# Altium schematic symbol library SCHLIB.SchLib: 2608 symbols (part 5 of 20) (continued)
## IC-AD7124-8BCPZ-RL7 (continued)
IC ADC 24BIT SIGMA-DELTA 32LFCSP; Manufacturer: Analog Devices; Manufacturer Part Number: AD7124-8BCPZ; Number of Bits: 24; Sampling Rate: 19.2KS/s; Interface: SPI; Number of A/D Converters: 1; Resolution: 24b; Min Supply Voltage: 2.7V; Max Supply Voltage: 3.6V; Dual Supply Voltage: 1.8V; Polarity: Bipolar,Unipolar; Supply Type: Analog,Digital; Input Capacitance: 5.5pF; Common Mode Rejection Ratio: 76dB; Quiescent Current: 2.8mA; Operating Supply Current: 5.6mA; Power Supply Rejection Ratio (PSRR): 95dB; Settling Time: 1us; Slew Rate: 20V/µs; Input Offset Voltage (Vos): 1mV; ComponentLink1URL: http://www.mouser.com/ds/2/609/AD7124-8-586740.pdf?src-supplier=Mouser; ComponentLink1Description: http://www.mouser.com/ds/2/609/AD7124-8-586740.pdf?src-supplier=Mouser; ComponentLink2URL: http://www.analog.com/media/en/technical-documentation/data-sheets/AD7124-8.pdf?src-supplier=Digi-Key; ComponentLink2Description: http://www.analog.com/media/en/technical-documentation/data-sheets/AD7124-8.pdf?src-supplier=Digi-Key; ComponentLink3URL: http://www.analog.com/media/en/technical-documentation/data-sheets/AD7124-8.pdf?src-supplier=Avnet; ComponentLink3Description: http://www.analog.com/media/en/technical-documentation/data-sheets/AD7124-8.pdf?src-supplier=Avnet; ComponentLink4URL: https://www.analog.com/media/en/technical-documentation/data-sheets/ad7124-8.pdf?src-supplier=Digi-Key; ComponentLink4Description: https://www.analog.com/media/en/technical-documentation/data-sheets/ad7124-8.pdf?src-supplier=Digi-Key; Supplier 1: Digi-Key; Supplier Part Number 1: AD7124-8BCPZ-ND; Stock: 2540; Pricing: 1=11.73, 10=10.6, 25=10.1064, 100=8.381, 250=7.6415, 500=7.1485 (USD); RoHS: Yes; Mount: Surface Mount; Number of Pins: 32; Min Operating Temperature: -55°C; Max Operating Temperature: 125°C; Packaging: Tray; Length: 5.1mm; Height: 0.75mm; Width: 5.1mm; REACH SVHC: No SVHC; Lead Free: Contains Lead; ComponentLink5URL: http://www.farnell.com/datasheets/2251043.pdf?src-supplier=Farnell; ComponentLink5Description: http://www.farnell.com/datasheets/2251043.pdf?src-supplier=Farnell; ComponentLink6URL: http://www.farnell.com/datasheets/2081834.pdf?src-supplier=Element14; ComponentLink6Description: http://www.farnell.com/datasheets/2081834.pdf?src-supplier=Element14
footprint 32-WFQFN EP (QFN, 32-Leads, Body 5.1x5.1mm, Pitch 0.5mm, Thermal Pad 3.45X3.45mm, IPC Low Density)
pins: 1 REGCAPD (in), 2 IOVDD (in), 3 DGND (in), 4 AIN0/IOUT/VBIAS (in), 5 AIN1/IOUT/VBIAS (in), 6 AIN2/IOUT/VBIAS/P1 (in), 7 AIN3/IOUT/VBIAS/P2 (in), 8 AIN4/IOUT/VBIAS/P3 (in), 9 AIN5/IOUT/VBIAS/P4 (in), 10 AIN6/IOUT/VBIAS (in), 11 AIN7/IOUT/VBIAS (in), 12 REFIN1(+) (in), 13 REFIN1(−) (in), 14 AIN8/IOUT/VBIAS (in), 15 AIN9/IOUT/VBIAS (in), 16 AIN10/IOUT/VBIAS (in), 17 AIN11/IOUT/VBIAS (in), 18 AIN12/IOUT/VBIAS (in), 19 AIN13/IOUT/VBIAS (in), 20 AIN14/IOUT/VBIAS/REFIN2(+) (in), 21 AIN15/IOUT/VBIAS/REFIN2(-) (in), 22 REFOUT (in), 23 AVSS (in), 24 REGCAPA (in), 25 PSW (in), 26 AVDD (in), 27 SYNC (in), 28 DOUT/ARDY (in), 29 DIN (in), 30 SCLK (in), 31 CLK (in), 32 CS (in), EP (in)

## IC-AD8420ARMZ
designator U?, comment AD8420
IC INST AMP 1 CIRCUIT 8MSOP; Manufacturer: Analog Devices; Manufacturer Part Number: AD8420ARMZ; Min Dual Supply Voltage: 2.7V; Max Dual Supply Voltage: 18V; Input Bias Current: 20nA; Input Offset Voltage (Vos): 125uV; Voltage Gain: 60dB; Number of Circuits: 1; Operating Supply Current: 80uA; Output Current per Channel: 10mA; Bandwidth: 2.5kHz; Slew Rate: 1V/µs; Max Supply Voltage: 36V; Common Mode Rejection Ratio: 100dB; Nominal Supply Current: 75uA; Input Resistance: 1GR; -3db Bandwidth: 250kHz; Number of Amplifiers: 3; Supplier 1: Digi-Key; Supplier Part Number 1: AD8420ARMZ-ND; Stock: 1212; Pricing: 1=2.86, 10=2.571, 25=2.4252, 100=1.94, 250=1.6975, 500=1.649, 1000=1.4065 (USD); RoHS: Yes; Mount: Surface Mount; Case/Package: MSOP; Number of Pins: 8; Contact Plating: Tin,Matte; Min Operating Temperature: -40°C; Max Operating Temperature: 85°C; Number of Elements: 1; Packaging: Rail/Tube; Min Supply Voltage: 2.7V; Number of Channels: 1; Package Quantity: 50; Power Supply Rejection Ratio (PSRR): 100dB; Max Supply Current: 80uA; Length: 3.2mm; Height: 0.95mm; Width: 3.2mm; Lead Free: Contains Lead; REACH SVHC: No SVHC; ComponentLink1URL: https://datasheet.ciiva.com/1135/1525799-1135414.pdf?src-supplier=Element14; ComponentLink1Description: https://datasheet.ciiva.com/1135/1525799-1135414.pdf?src-supplier=Element14; ComponentLink2URL: https://datasheet.ciiva.com/2976/ad8420-2976022.pdf?src-supplier=Avnet; ComponentLink2Description: https://datasheet.ciiva.com/2976/ad8420-2976022.pdf?src-supplier=Avnet; ComponentLink3URL: https://datasheet.ciiva.com/1802/ad8420-1802925.pdf?src-supplier=Digi-Key; ComponentLink3Description: https://datasheet.ciiva.com/1802/ad8420-1802925.pdf?src-supplier=Digi-Key; ComponentLink4URL: https://datasheet.ciiva.com/17373/ad8420-17373343.pdf?src-supplier=Avnet+Europe; ComponentLink4Description: https://datasheet.ciiva.com/17373/ad8420-17373343.pdf?src-supplier=Avnet+Europe
footprint MSOP8 (TSOP, 8-Leads, Body 3,00x3,00mm, Pitch 0,65mm, IPC Medium Density)
pins: 2 +IN A (in), 3 -IN A (in), 4 -VS (power), 5 +VS (power), 6 REF (power), 7 FB (power), 8 OUT (out)

## IC-AD9837BCPZ-RL7
designator U?, comment AD9837  Supplier Part Number 1: AD9837BCPZ-RL7CT-ND
IC WAVEFORM GEN PROG 10LFCSP; Manufacturer: Analog Devices; Manufacturer Part Number: AD9837BCPZ-RL7; Min Supply Voltage: 2.3V; Max Supply Voltage: 5.5V; Resolution: 10b; Operating Supply Voltage: 5V; Number of Converters: 1; Signal to Noise Ratio (SNR): -64dB; Nominal Output Voltage: 645mV; Max Supply Current: 5.5mA; Frequency: 16MHz; Output Type: Voltage; Washability: OK; ComponentLink1URL: https://datasheet.ciiva.com/1138/1700956-1138402.pdf?src-supplier=Element14; ComponentLink1Description: https://datasheet.ciiva.com/1138/1700956-1138402.pdf?src-supplier=Element14; ComponentLink2URL: https://datasheet.ciiva.com/1699/ad9837-1699592.pdf?src-supplier=Digi-Key; ComponentLink2Description: https://datasheet.ciiva.com/1699/ad9837-1699592.pdf?src-supplier=Digi-Key; ComponentLink3URL: https://datasheet.ciiva.com/1699/ad9837-1699593.pdf?src-supplier=Digi-Key; ComponentLink3Description: https://datasheet.ciiva.com/1699/ad9837-1699593.pdf?src-supplier=Digi-Key; ComponentLink4URL: https://datasheet.ciiva.com/1699/ad9837-1699594.pdf?src-supplier=Digi-Key; ComponentLink4Description: https://datasheet.ciiva.com/1699/ad9837-1699594.pdf?src-supplier=Digi-Key; Supplier 1: Digi-Key; Stock 1: 2484; Pricing 1: 1=4.86000, 10=4.36300, 25=4.12520, 100=3.57510, 250=3.39180, 500=3.04344 (USD); RoHS: Yes; Mount: Surface Mount; Number of Pins: 10; Contact Plating: Tin,Matte; Min Operating Temperature: -40°C; Max Operating Temperature: 85°C; Packaging: Tape and Reel; Package Quantity: 1500; Number of D/A Converters: 1; Number of Outputs: 1; Lead Free: Contains Lead; REACH SVHC: No SVHC; ComponentLink5URL: https://datasheet.ciiva.com/14814/73ad9837-14814428.pdf?src-supplier=Arrow; ComponentLink5Description: https://datasheet.ciiva.com/14814/73ad9837-14814428.pdf?src-supplier=Arrow; ComponentLink6URL: https://datasheet.ciiva.com/25889/ad9837-25889607.pdf?src-supplier=Avnet+Europe; ComponentLink6Description: https://datasheet.ciiva.com/25889/ad9837-25889607.pdf?src-supplier=Avnet+Europe; ComponentLink7URL: https://datasheet.ciiva.com/14849/ad9837-14849784.pdf?src-supplier=Digi-Key; ComponentLink7Description: https://datasheet.ciiva.com/14849/ad9837-14849784.pdf?src-supplier=Digi-Key; ComponentLink8URL: https://datasheet.ciiva.com/14849/ad9837-14849785.pdf?src-supplier=Digi-Key; ComponentLink8Description: https://datasheet.ciiva.com/14849/ad9837-14849785.pdf?src-supplier=Digi-Key; ComponentLink9URL: https://datasheet.ciiva.com/14799/ad9837-14799306.pdf?src-supplier=Digi-Key; ComponentLink9Description: https://datasheet.ciiva.com/14799/ad9837-14799306.pdf?src-supplier=Digi-Key; ComponentLink10URL: https://datasheet.ciiva.com/3177/ad9837-3177420.pdf?src-supplier=Avnet; ComponentLink10Description: https://datasheet.ciiva.com/3177/ad9837-3177420.pdf?src-supplier=Avnet
footprint WFDFN-10 (SON, 10-Leads, Body 3,00x3,00mm, Pitch 0,50mm, Thermal Pad 2,36x1,49mm, IPC Medium Density)
pins: 1 COMP, 2 VDD, 3 CAP/2V5, 4 DGND, 5 MCLK, 6 SDATA, 7 SCLK, 8 FSYNC, 9 AGND, 10 VOUT

## IC-ADA4096-2ACPZ-R7
designator U?, comment ADA4096-2
IC OPAMP GP 2 CIRCUIT 8LFCSP; Manufacturer: Analog Devices; Manufacturer Part Number: ADA4096-2ACPZ-R7; Input Capacitance: 7pF; Max Dual Supply Voltage: 15V; Min Dual Supply Voltage: 1.5V; Quiescent Current: 60uA; Slew Rate: 0.25V/µs; -3db Bandwidth: 1.52MHz; Common Mode Rejection Ratio: 77dB; Max Supply Voltage: 30V; Min Supply Voltage: 3V; Voltage Gain: 111dB; Unity Gain Bandwidth Product: 550kHz; Bandwidth: 786kHz; Number of Circuits: 2; Input Bias Current: 3nA; Input Offset Voltage (Vos): 300uV; Operating Supply Current: 120uA; Output Current per Channel: 10mA; Input Voltage Noise Density: 27nV/sqrt Hz; Power Supply Rejection Ratio (PSRR): 100dB; Number of Bits: 24; Sampling Rate: 19.2KS/s; Interface: SPI; Number of A/D Converters: 1; Resolution: 24b; Dual Supply Voltage: 1.8V; Polarity: Bipolar,Unipolar; Supply Type: Analog,Digital; Settling Time: 1us; Supplier 1: Digi-Key; Supplier Part Number 1: ADA4096-2ACPZ-R7CT-ND; Stock: 21540; Pricing: 1=4.96, 10=4.451, 25=4.2076, 100=3.4595, 250=3.1042, 500=2.992, 1000=2.7115 (USD); RoHS: Yes; Mount: Surface Mount; Case/Package: SOP; Number of Pins: 8; Contact Plating: Gold; Min Operating Temperature: -40°C; Max Operating Temperature: 125°C; Packaging: Tape and Reel; Package Quantity: 3000; Gain Bandwidth Product: 786kHz; Number of Channels: 2; Number of Elements: 2; Number of Amplifiers: 2; Lead Free: Contains Lead; REACH SVHC: No SVHC; ComponentLink1URL: https://datasheet.ciiva.com/6628/ada4096-2-4096-4-6628648.pdf?src-supplier=Digi-Key; ComponentLink1Description: https://datasheet.ciiva.com/6628/ada4096-2-4096-4-6628648.pdf?src-supplier=Digi-Key; ComponentLink2URL: https://datasheet.ciiva.com/6628/ada4096-2-4096-4-6628649.pdf?src-supplier=Digi-Key; ComponentLink2Description: https://datasheet.ciiva.com/6628/ada4096-2-4096-4-6628649.pdf?src-supplier=Digi-Key; ComponentLink3URL: https://datasheet.ciiva.com/11712/ada4096-2-4096-4-11712087.pdf?src-supplier=Avnet; ComponentLink3Description: https://datasheet.ciiva.com/11712/ada4096-2-4096-4-11712087.pdf?src-supplier=Avnet; ComponentLink4URL: https://datasheet.ciiva.com/6628/ada4096-2-4096-4-6628650.pdf?src-supplier=Digi-Key; ComponentLink4Description: https://datasheet.ciiva.com/6628/ada4096-2-4096-4-6628650.pdf?src-supplier=Digi-Key; ComponentLink5URL: https://datasheet.ciiva.com/17569/ada4096-2-4096-4-17569245.pdf?src-supplier=Avnet+Europe; ComponentLink5Description: https://datasheet.ciiva.com/17569/ada4096-2-4096-4-17569245.pdf?src-supplier=Avnet+Europe; Supplier 2: Digi-Key; Supplier Part Number 2: AD7124-8BCPZ-ND; Length: 5.1mm; Height: 0.75mm; Width: 5.1mm; ComponentLink6URL: http://www.farnell.com/datasheets/2251043.pdf?src-supplier=Farnell; ComponentLink6Description: http://www.farnell.com/datasheets/2251043.pdf?src-supplier=Farnell; ComponentLink7URL: http://www.mouser.com/ds/2/609/AD7124-8-586740.pdf?src-supplier=Mouser; ComponentLink7Description: http://www.mouser.com/ds/2/609/AD7124-8-586740.pdf?src-supplier=Mouser; ComponentLink8URL: http://www.analog.com/media/en/technical-documentation/data-sheets/AD7124-8.pdf?src-supplier=Avnet; ComponentLink8Description: http://www.analog.com/media/en/technical-documentation/data-sheets/AD7124-8.pdf?src-supplier=Avnet; ComponentLink9URL: https://www.analog.com/media/en/technical-documentation/data-sheets/AD7124-8.pdf?src-supplier=Digi-Key; ComponentLink9Description: https://www.analog.com/media/en/technical-documentation/data-sheets/AD7124-8.pdf?src-supplier=Digi-Key; ComponentLink10URL: http://www.farnell.com/datasheets/2081834.pdf?src-supplier=Element14; ComponentLink10Description: http://www.farnell.com/datasheets/2081834.pdf?src-supplier=Element14
footprint 8-UFDFN EP (SON, 8-Leads, Body 2x2mm, Pitch 0.5mm, Thermal Pad 1.6x1mm)
part A pins: 1 OUT A (out), 2 -IN A (in), 3 +IN A (in), 4 -V (power), 8 +V (power)
part B pins: 4 -V (power), 5 +IN B (in), 6 -IN B (in), 7 OUT B (out), 8 +V (power)
1 alternate drawing of the same symbol

## IC-ADC104S021CIMMX
designator U?, comment ADC104S021
ADC 10BIT 4CH 200KSPS 10-MSOP; Manufacturer: TI National Semiconductor; Manufacturer Part Number: ADC104S021CIMMX/NOPB; Interface: SPI,Serial; Max Power Dissipation: 8mW; Number of Channels: 4; Max Supply Voltage: 5.25V; Min Supply Voltage: 2.7V; Number of Bits: 10; Sampling Rate: 200KS/s; Number of Converters: 1; Resolution: 10b; Polarity: Unipolar; Integral Nonlinearity (INL): -0.4LSB; Supply Type: Single; Signal to Noise Ratio (SNR): 61.8dB; Power Consumption: 1.94mW; Differential Nonlinearity: 0.4LSB; Full Scale Error: 0.7LSB; Operating Supply Voltage: 5V; Supplier 1: Digi-Key; Supplier Part Number 1: 296-44813-1-ND; Stock: 2642; Pricing: 1=2.65, 10=2.38, 25=2.25, 100=1.85, 250=1.66, 500=1.6, 1000=1.33 (USD); RoHS: Yes; Mount: Surface Mount; Case/Package: VSSOP; Number of Pins: 10; Contact Plating: Tin,Matte; Min Operating Temperature: -40°C; Max Operating Temperature: 85°C; Packaging: Tape and Reel; Package Quantity: 3500; Number of Inputs: 4; Number of A/D Converters: 1; Number of Analog Inputs: 4; Number of Elements: 1; Conversion Rate: 200KS/s; Radiation Hardening: No; Lead Free: Lead Free; ComponentLink1URL: https://datasheet.ciiva.com/26888/getdatasheetpartid-660655-26888437.pdf?src-supplier=Verical; ComponentLink1Description: https://datasheet.ciiva.com/26888/getdatasheetpartid-660655-26888437.pdf?src-supplier=Verical; ComponentLink2URL: https://datasheet.ciiva.com/6659/adc104s021-6659898.pdf?src-supplier=Digi-Key; ComponentLink2Description: https://datasheet.ciiva.com/6659/adc104s021-6659898.pdf?src-supplier=Digi-Key
footprint VSSOP-10 (TSSOP, 10-Leads, Body 3x3mm, Pitch 0.5mm, IPC Low Density)
pins: 1 ~{CS} (in), 2 VA (power), 3 GND (power), 4 IN4 (in), 5 IN3 (in), 6 IN2 (in), 7 IN1 (in), 8 DIN (in), 9 DOUT (out), 10 SCLK (in)

## IC-ADC124S021CIMM/NOPB
designator U?, comment ADC124S021
IC ADC 12BIT SAR 10VSSOP; Manufacturer: TI National Semiconductor; Manufacturer Part Number: ADC124S021CIMM/NOPB; Interface: SPI,Serial; Number of A/D Converters: 1; Max Power Dissipation: 11mW; Max Supply Voltage: 5.25V; Min Supply Voltage: 2.7V; Number of Bits: 12; Sampling Rate: 200KS/s; Number of Inputs: 4; Resolution: 12b; Polarity: Unipolar; Signal to Noise Ratio (SNR): 72dB; Operating Supply Voltage: 5V; Nominal Supply Current: 1.5mA; Integral Nonlinearity (INL): -1.1LSB; Power Consumption: 2.2mW; Supplier 1: Digi-Key; Supplier Part Number 1: ADC124S021CIMM/NOPBCT-ND; Stock: 11575; Pricing: 1=3.45, 10=3.094, 25=2.9252, 100=2.405, 250=2.158, 500=2.08 (USD); RoHS: Yes; Mount: Surface Mount; Case/Package: MSOP; Number of Pins: 10; Min Operating Temperature: -40°C; Max Operating Temperature: 85°C; Package Quantity: 1000; Power Dissipation: 11mW; Number of Analog Inputs: 4; Packaging: Tape and Reel; Number of Channels: 4; Number of Converters: 1; Number of Elements: 1; Termination: SMD/SMT; Conversion Rate: 200KS/s; Length: 3mm; Height: 0.86mm; Width: 3mm; Radiation Hardening: No; REACH SVHC: No SVHC; Lead Free: Lead Free; ComponentLink1URL: https://datasheet.ciiva.com/3037/adc124s021-3037889.pdf?src-supplier=Avnet; ComponentLink1Description: https://datasheet.ciiva.com/3037/adc124s021-3037889.pdf?src-supplier=Avnet; ComponentLink2URL: https://datasheet.ciiva.com/41460/001186665-da-01-en-ic-adc-1-adc124s021cimm-nopb-msop-10-tid-41460960.pdf?src-supplier=Conrad; ComponentLink2Description: https://datasheet.ciiva.com/41460/001186665-da-01-en-ic-adc-1-adc124s021cimm-nopb-msop-10-tid-41460960.pdf?src-supplier=Conrad; ComponentLink3URL: https://datasheet.ciiva.com/7988/1919066-7988869.pdf?src-supplier=Element14; ComponentLink3Description: https://datasheet.ciiva.com/7988/1919066-7988869.pdf?src-supplier=Element14; ComponentLink4URL: https://datasheet.ciiva.com/25992/adc124s021-25992264.pdf?src-supplier=Avnet+Europe; ComponentLink4Description: https://datasheet.ciiva.com/25992/adc124s021-25992264.pdf?src-supplier=Avnet+Europe; ComponentLink5URL: https://datasheet.ciiva.com/6666/adc124s021-6666364.pdf?src-supplier=Digi-Key; ComponentLink5Description: https://datasheet.ciiva.com/6666/adc124s021-6666364.pdf?src-supplier=Digi-Key; ComponentLink6URL: https://datasheet.ciiva.com/6666/adc124s021-6666366.pdf?src-supplier=Digi-Key; ComponentLink6Description: https://datasheet.ciiva.com/6666/adc124s021-6666366.pdf?src-supplier=Digi-Key; ComponentLink7URL: https://datasheet.ciiva.com/6666/adc124s021-6666367.pdf?src-supplier=Digi-Key; ComponentLink7Description: https://datasheet.ciiva.com/6666/adc124s021-6666367.pdf?src-supplier=Digi-Key
footprint VSSOP-10 (TSSOP, 10-Leads, Body 3x3mm, Pitch 0.5mm, IPC Low Density)
pins: 1 ~{CS} (in), 2 VA (power), 3 GND (power), 4 IN4 (in), 5 IN3 (in), 6 IN2 (in), 7 IN1 (in), 8 DIN (in), 9 DOUT (out), 10 SCLK (in)

## IC-ADP7142ACPZN-R7
designator IC?, comment ADP7142ACPZN-R7
LDO Regulator Pos 1.5V to 5V 0.2A 6-Pin LFCSP EP T/R; Manufacturer: Analog Devices; Number of Outputs: 1; Max Input Voltage: 40V; Input Bias Current: 1uA; Min Input Voltage: 2.7V; Operating Supply Current: 180uA; Power Supply Rejection Ratio (PSRR): 50dB; Output Type: Adjustable; Polarity: Positive; Quiescent Current: 140uA; Accuracy: 0.8%; Max Output Current: 200mA; Output Voltage: 39.8V; Dropout Voltage: 200mV; Min Current Limit: 250mA; Supplier 1: Mouser; Manufacturer Part Number: ADP7142ACPZN-R7; Stock 1: 18194; Pricing 1: 1=2,91000, 10=2,61000, 25=2,47000, 100=2,03000, 250=1,82000, 500=1,76000 (USD); RoHS: Yes; Mount: Surface Mount; Number of Pins: 6; Contact Plating: Gold; Min Operating Temperature: -40°C; Max Operating Temperature: 125°C; Package Quantity: 3000; Packaging: Tape and Reel; Output Current: 200mA; Number of Regulators: 1; Lead Free: Contains Lead; ComponentLink1URL: http://www.mouser.com/ds/2/609/ADP7142-878904.pdf?src-supplier=Mouser; ComponentLink1Description: http://www.mouser.com/ds/2/609/ADP7142-878904.pdf?src-supplier=Mouser; ComponentLink2URL: https://www.analog.com/media/en/technical-documentation/data-sheets/ADP7142.pdf?src-supplier=Digi-Key; ComponentLink2Description: https://www.analog.com/media/en/technical-documentation/data-sheets/ADP7142.pdf?src-supplier=Digi-Key; ComponentLink3URL: http://www.analog.com/static/imported-files/data_sheets/ADP7142.pdf?src-supplier=Avnet; ComponentLink3Description: http://www.analog.com/static/imported-files/data_sheets/ADP7142.pdf?src-supplier=Avnet; Supplier Part Number 1: 584-ADP7142ACPZN-R7
footprint LFCSP CP-6-3 (6-Lead Lead Frame Chip Scale Package [LFCSP]  2.00 mm × 2.00 mm Body and 0.55 mm Package Height)
pins: 1 VOUT, 2 SNS/ADJ, 3 GND, 4 EN, 5 SS, 6 VIN, 7 EP

## IC-ADS1120IRVAT
designator IC?, comment ADS1120IRVAT
IC ADC CONV 16BIT LP LN 16VQFN; Manufacturer: Texas Instruments; Number of Bits: 16; Sampling Rate: 2000S/s; Number of A/D Converters: 1; Resolution: 16b; Polarity: Bipolar,Unipolar; Supply Type: Analog,Digital; Max Supply Voltage: 5.5V; Dual Supply Voltage: 2.5V; Max Dual Supply Voltage: 2.75V; Power Dissipation: 2.1mW; Min Supply Voltage: 2.3V; Number of Inputs: 4; Interface: SPI; Supplier 1: Arrow; Manufacturer Part Number: ADS1120IRVAT; Stock 1: 95; Pricing 1: 1=4,43700, 10=4,32800, 25=4,25300, 250=4,94100, 2500=4,83200, 25000=4,19000, 125000=3,84500, 250000=3,84200 (USD); RoHS: Yes; Mount: Surface Mount; Case/Package: VQFN; Number of Pins: 16; Contact Plating: Gold; Min Operating Temperature: -40°C; Max Operating Temperature: 125°C; Min Dual Supply Voltage: 2.3V; Package Quantity: 250; Packaging: Cut Tape; Lead Free: Lead Free; ComponentLink1URL: https://datasheet.ciiva.com/29661/ads1120-29661123.pdf?src-supplier=Digi-Key; ComponentLink1Description: https://datasheet.ciiva.com/29661/ads1120-29661123.pdf?src-supplier=Digi-Key; ComponentLink2URL: https://datasheet.ciiva.com/48514/ads1120-48514092.pdf?src-supplier=Avnet; ComponentLink2Description: https://datasheet.ciiva.com/48514/ads1120-48514092.pdf?src-supplier=Avnet; Supplier Part Number 1: ADS1120IRVAT
footprint S-PVQFN-N16 (QFN, 16-Leads, Body 3,50x3,50mm, Pitch 0,50mm, Thermal Pad 2,14x2,14mm, IPC Medium Density)
pins: 1 CLK, 2 DGND (power), 3 AVSS (power), 4 AIN3/REFN1, 5 AIN2, 6 REFNO, 7 REFPO, 8 AIN1, 9 AIN0/REFP1, 10 AVDD (power), 11 DVDD (power), 12 ~{DRDY}, 13 DOUT/~{DRDY}, 14 DIN, 15 SCLK, 16 ~{CS}, 17 EP (power)

## IC-AND-SN74LVC1G08DCKR
designator U?, comment SN74LVC1G08DCKR
IC GATE AND 1CH 2-INP SC70-5; Manufacturer: Texas Instruments; Min Supply Voltage: 1.65V; Max Supply Voltage: 5.5V; Propagation Delay: 4ns; Number of Inputs: 2; Number of Outputs: 1; Low Level Output Current: 32mA; Quiescent Current: 10uA; High Level Output Current: -32mA; Schmitt Trigger Input: No; Washability: OK; Manufacturer Part Number: SN74LVC1G08DCKR; RoHS: Yes; Mount: Surface Mount; Case/Package: SC; Number of Pins: 5; Weight: 8.8E-05oz; Contact Plating: Gold; Min Operating Temperature: -40°C; Max Operating Temperature: 125°C; Logic Function: AND; Packaging: Tape and Reel; Package Quantity: 1; Number of Gates: 1; Number of Input Lines: 2; Number of Output Lines: 1; Number of Circuits: 1; Number of Elements: 1; Turn-On Delay Time: 4ns; Number of Bits: 1; Output Current: 32mA; Max Output Current: 32mA; Termination: SMD/SMT; Length: 2.15mm; Height: 1mm; Width: 1.4mm; Radiation Hardening: No; REACH SVHC: No SVHC; Lead Free: Lead Free; Supplier 1: Digi-Key; Supplier Part Number 1: 296-11602-1-ND; Stock 1: 120042; Pricing 1: 1=0.27000, 10=0.22100, 25=0.18560, 100=0.11740, 250=0.09064, 500=0.07726, 1000=0.05253 (USD); ComponentLink1URL: https://datasheet.ciiva.com/14290/sn74lvc1g08-14290720.pdf?src-supplier=Avnet; ComponentLink1Description: https://datasheet.ciiva.com/14290/sn74lvc1g08-14290720.pdf?src-supplier=Avnet; ComponentLink2URL: https://datasheet.ciiva.com/1864/sn74lvc1g08-1864341.pdf?src-supplier=Digi-Key; ComponentLink2Description: https://datasheet.ciiva.com/1864/sn74lvc1g08-1864341.pdf?src-supplier=Digi-Key; ComponentLink3URL: https://datasheet.ciiva.com/1864/sn74lvc1g08-1864342.pdf?src-supplier=Digi-Key; ComponentLink3Description: https://datasheet.ciiva.com/1864/sn74lvc1g08-1864342.pdf?src-supplier=Digi-Key; ComponentLink4URL: https://datasheet.ciiva.com/1864/sn74lvc1g08-1864343.pdf?src-supplier=Digi-Key; ComponentLink4Description: https://datasheet.ciiva.com/1864/sn74lvc1g08-1864343.pdf?src-supplier=Digi-Key; ComponentLink5URL: https://datasheet.ciiva.com/26048/sn74lvc1g08-26048426.pdf?src-supplier=Avnet+Europe; ComponentLink5Description: https://datasheet.ciiva.com/26048/sn74lvc1g08-26048426.pdf?src-supplier=Avnet+Europe; ComponentLink6URL: https://datasheet.ciiva.com/16503/sn74lvc1g08-16503404.pdf?src-supplier=Avnet+Asia; ComponentLink6Description: https://datasheet.ciiva.com/16503/sn74lvc1g08-16503404.pdf?src-supplier=Avnet+Asia; ComponentLink7URL: https://datasheet.ciiva.com/14290/sn74lvc1g08-14290717.pdf?src-supplier=Avnet; ComponentLink7Description: https://datasheet.ciiva.com/14290/sn74lvc1g08-14290717.pdf?src-supplier=Avnet; ComponentLink8URL: https://datasheet.ciiva.com/28540/1772545-28540798.pdf?src-supplier=Element14; ComponentLink8Description: https://datasheet.ciiva.com/28540/1772545-28540798.pdf?src-supplier=Element14
footprint TSSOP5 (SOT23, 5-Leads, Body 2.15x1.4mm, Pitch 0.65mm, IPC High Density)
pins: 1 A (in) "Input A", 2 B (in) "Input B", 3 GND (power) "Ground Pin", 4 Y (out) "Input A", 5 VCC (power) "Power Pin"

## IC-AOZ1282CI
designator U?, comment AOZ1282CI  Package: SOT23-6
IC REG BUCK ADJ 1.2A SOT23-6; Manufacturer: Alpha & Omega Semiconductor; Number of Outputs: 1; Min Input Voltage: 4.5V; Max Input Voltage: 36V; Min Output Voltage: 800mV; Switching Frequency: 450kHz; Synchronous Rectifier: No; Output Type: Adjustable; Output Configuration: Positive; Washability: OK; Supplier 1: Digi-Key; Stock 1: 332367; Pricing 1: 1=0.89, 10=0.779, 25=0.6896, 100=0.6007, 250=0.52284, 500=0.44496, 1000=0.35597 (USD); Mount: Surface Mount; Number of Pins: 6; Min Operating Temperature: -40°C; Max Operating Temperature: 85°C; Packaging: Tape and Reel; Max Output Voltage: 36V; Output Current: 1.2A; Package Quantity: 1; Output Voltage: 36V; Lead Free: Lead Free; ComponentLink1URL: http://aosmd.com/res/data_sheets/AOZ1282CI.pdf; ComponentLink1Description: http://aosmd.com/res/data_sheets/AOZ1282CI.pdf; ComponentLink2URL: http://components.arrow.com/part/dataview/0323_06084387; ComponentLink2Description: http://components.arrow.com/part/dataview/0323_06084387; Supplier Part Number 1: 785-1613-6-ND; Manufacturer Part Number: AOZ1282CI; RoHS: Yes; Case/Package: SOT-23-6; ComponentLink3URL: https://datasheet.ciiva.com/15081/aoz1282ci-15081829.pdf?src-supplier=Digi-Key; ComponentLink3Description: https://datasheet.ciiva.com/15081/aoz1282ci-15081829.pdf?src-supplier=Digi-Key; ComponentLink4URL: https://datasheet.ciiva.com/15268/1934aoz1282ci-15268300.pdf?src-supplier=Arrow+Europe; ComponentLink4Description: https://datasheet.ciiva.com/15268/1934aoz1282ci-15268300.pdf?src-supplier=Arrow+Europe; ComponentLink5URL: https://datasheet.ciiva.com/18553/aoz1282ci-18553035.pdf?src-supplier=Digi-Key; ComponentLink5Description: https://datasheet.ciiva.com/18553/aoz1282ci-18553035.pdf?src-supplier=Digi-Key; ComponentLink6URL: https://datasheet.ciiva.com/18553/aoz1282ci-18553036.pdf?src-supplier=Digi-Key; ComponentLink6Description: https://datasheet.ciiva.com/18553/aoz1282ci-18553036.pdf?src-supplier=Digi-Key; ComponentLink7URL: https://datasheet.ciiva.com/18553/aoz1282ci-18553037.pdf?src-supplier=Digi-Key; ComponentLink7Description: https://datasheet.ciiva.com/18553/aoz1282ci-18553037.pdf?src-supplier=Digi-Key
footprint SOT23-6L
pins: 1 BS (in), 2 GND (power), 3 FB (in), 4 EN (in), 5 IN (power), 6 LX (out)

## IC-AP2210N-5.0TRG1
designator IC?, comment REG LINEAR 5V 300MA
IC REG LINEAR 5V 300MA SOT23-3; Manufacturer: Diodes; Manufacturer Part Number: AP2210N-5.0TRG1; Polarity: Positive; Quiescent Current: 180uA; Accuracy: 1%; Number of Outputs: 1; Max Input Voltage: 13.2V; Min Input Voltage: 2.5V; Dropout Voltage: 500mV; Max Supply Current: 15mA; Power Supply Rejection Ratio (PSRR): 75dB; Output Type: Fixed; Supplier 1: Mouser; Stock 1: 42905; Pricing 1: 1=0,41000, 10=0,28600, 100=0,13200, 1000=0,10100, 3000=0,08600, 9000=0,07900 (USD); RoHS: Yes; Mount: Surface Mount; Case/Package: TO-236-3; Number of Pins: 3; Contact Plating: Tin; Min Operating Temperature: -40°C; Max Operating Temperature: 125°C; Max Output Current: 300mA; Packaging: Tape and Reel; Output Voltage: 5V; Output Current: 300mA; Number of Regulators: 1; Output Configuration: Positive; Min Output Voltage: 5V; ComponentLink1URL: https://datasheet.ciiva.com/70043/ap2210-70043557.pdf?src-supplier=Digi-Key; ComponentLink1Description: https://datasheet.ciiva.com/70043/ap2210-70043557.pdf?src-supplier=Digi-Key; Supplier Part Number 1: 621-AP2210N-5.0TRG1
footprint SOT23-3
pins: 1 GND, 2 OUT, 3 IN

## IC-AP6714M10G-13
designator U?, comment AP6714
IC REG BST ADJ 1.6A SYNC 10MSOP; Manufacturer: Diodes; Manufacturer Part Number: AP6714M10G-13; Efficiency: 94%; Min Input Voltage: 900mV; Max Input Voltage: 5.5V; Number of Outputs: 1; Switching Frequency: 1.8MHz; Operating Supply Current: 150uA; Min Output Voltage: 1.8V; Output Type: Adjustable; Synchronous Rectifier: Yes; Output Configuration: Positive; Topology: Boost; Washability: OK; Supplier 1: Digi-Key; Supplier Part Number 1: AP6714M10GDICT-ND; Stock 1: 566; Pricing 1: 1=0.88000, 10=0.77200, 25=0.72560, 100=0.54990, 250=0.46800, 500=0.44460, 1000=0.33930 (USD); RoHS: Yes; Mount: Surface Mount; Case/Package: MSOP; Number of Pins: 10; Weight: 0.005051oz; Contact Plating: Tin,Matte; Min Operating Temperature: -40°C; Max Operating Temperature: 85°C; Output Voltage: 5.5V; Max Output Current: 1.6A; Min Supply Voltage: 900mV; Max Output Voltage: 5.5V; Output Current: 1.6A; Packaging: Tape and Reel; Package Quantity: 1; Length: 2.95mm; Height: 0.95mm; Width: 2.95mm; Radiation Hardening: No; Lead Free: Lead Free; REACH SVHC: No SVHC; ComponentLink1URL: https://datasheet.ciiva.com/17293/ap6714-17293987.pdf?src-supplier=Avnet+Europe; ComponentLink1Description: https://datasheet.ciiva.com/17293/ap6714-17293987.pdf?src-supplier=Avnet+Europe; ComponentLink2URL: https://datasheet.ciiva.com/4879/ap6714-7414-4879290.pdf?src-supplier=Mouser; ComponentLink2Description: https://datasheet.ciiva.com/4879/ap6714-7414-4879290.pdf?src-supplier=Mouser; ComponentLink3URL: https://datasheet.ciiva.com/3222/ap6714-3222077.pdf?src-supplier=Avnet; ComponentLink3Description: https://datasheet.ciiva.com/3222/ap6714-3222077.pdf?src-supplier=Avnet; ComponentLink4URL: https://datasheet.ciiva.com/2023/ap6714-2023934.pdf?src-supplier=Digi-Key; ComponentLink4Description: https://datasheet.ciiva.com/2023/ap6714-2023934.pdf?src-supplier=Digi-Key; ComponentLink5URL: https://datasheet.ciiva.com/2023/ap6714-2023933.pdf?src-supplier=Digi-Key; ComponentLink5Description: https://datasheet.ciiva.com/2023/ap6714-2023933.pdf?src-supplier=Digi-Key; ComponentLink6URL: https://datasheet.ciiva.com/2023/ap6714-2023935.pdf?src-supplier=Digi-Key; ComponentLink6Description: https://datasheet.ciiva.com/2023/ap6714-2023935.pdf?src-supplier=Digi-Key
footprint MSOP10 (TSSOP, 10-Leads, Body 3,00x3,00mm, Pitch 0,50mm, IPC Medium Density)
pins: 1 VCC, 2 EN, 3 CC, 4 FB, 5 REF, 6 SGND, 7 PGND, 8 OCP, 9 LX, 10 OUT

## IC-AP7362A-33SP-13
designator U?, comment AP7362A
IC REG LINEAR 3.3V 1.5A 8SO; Manufacturer: Diodes; Manufacturer Part Number: AP7362A-33SP-13; Number of Regulators: 1; Polarity: Positive; Quiescent Current: 25nA; Min Input Voltage: 2.2V; Max Input Voltage: 5.5V; Accuracy: 1.5%; Output Type: Fixed; Supplier 1: Digi-Key; Supplier Part Number 1: AP7362A-33SP-13DICT-ND; Stock: 3699; Pricing: 1=0.6, 10=0.511, 25=0.4772, 100=0.3545, 250=0.3, 500=0.2863, 1000=0.2113 (USD); RoHS: Yes; Mount: Surface Mount; Case/Package: SOP; Number of Pins: 8; Contact Plating: Tin; Min Operating Temperature: -40°C; Max Operating Temperature: 85°C; Packaging: Tape and Reel; Output Voltage: 3.3V; Output Current: 1.5A; Number of Outputs: 1; Max Output Current: 1.5A; ComponentLink1URL: http://www.mouser.com/ds/2/115/AP7362-476331.pdf?src-supplier=Mouser; ComponentLink1Description: http://www.mouser.com/ds/2/115/AP7362-476331.pdf?src-supplier=Mouser; ComponentLink2URL: http://diodes.com/datasheets/AP7362.pdf?src-supplier=Avnet; ComponentLink2Description: http://diodes.com/datasheets/AP7362.pdf?src-supplier=Avnet; ComponentLink3URL: https://www.diodes.com/assets/Datasheets/AP7362.pdf?src-supplier=Digi-Key; ComponentLink3Description: https://www.diodes.com/assets/Datasheets/AP7362.pdf?src-supplier=Digi-Key
footprint SOIC8-EP (SOIC, 8-Leads, Body 5x4mm, Pitch 1.27mm, IPC Low Density)
pins: 1 GND, 2 EN, 3 IN, 4 IN, 5 OUT, 6 OUT, 7 OUT, 8 NC, EP

## IC-AP7363-HA-7
designator U?, comment AP7363
IC REG LIN POS ADJ 1.5A 8DFN; Manufacturer: Diodes; Manufacturer Part Number: AP7363-HA-7; Dropout Voltage: 190mV; Number of Outputs: 1; Min Input Voltage: 2.2V; Max Input Voltage: 5.5V; Output Voltage: 5V; Output Type: Adjustable; Min Output Voltage: 600mV; Polarity: Positive; Accuracy: 1.5%; Supplier 1: Digi-Key; Supplier Part Number 1: AP7363-HA-7DICT-ND; Stock: 9906; Pricing: 1=0.53, 10=0.455, 25=0.4244, 100=0.3151, 250=0.2666, 500=0.2545, 1000=0.1879 (USD); RoHS: Yes; Mount: Surface Mount; Case/Package: TO-252-3; Number of Pins: 8; Weight: 0.139332oz; Min Operating Temperature: -40°C; Max Operating Temperature: 85°C; Output Current: 1.5A; Package Quantity: 3000; Packaging: Tape and Reel; Max Output Current: 1.5A; Number of Regulators: 1; Max Output Voltage: 5V; Radiation Hardening: No; REACH SVHC: No SVHC; ComponentLink1URL: https://datasheet.ciiva.com/8078/1636611-8078229.pdf?src-supplier=Element14; ComponentLink1Description: https://datasheet.ciiva.com/8078/1636611-8078229.pdf?src-supplier=Element14; ComponentLink2URL: https://datasheet.ciiva.com/30016/ap7363-30016557.pdf?src-supplier=Avnet; ComponentLink2Description: https://datasheet.ciiva.com/30016/ap7363-30016557.pdf?src-supplier=Avnet; ComponentLink3URL: https://datasheet.ciiva.com/29568/ap7363-29568764.pdf?src-supplier=Digi-Key; ComponentLink3Description: https://datasheet.ciiva.com/29568/ap7363-29568764.pdf?src-supplier=Digi-Key
footprint 8-UFDFN EP (SON, 8-Leads, Body 2x2mm, Pitch 0.5mm, Thermal Pad 1.6x1mm)
pins: 1 GND_1 (in), 2 VIN_1, 3 VIN_2, 4 VIN_3, 5 VOUT_1, 6 VOUT_2, 7 VOUT_3, 8 ADJ, 9 GND_2 (in)
text: LDO

## IC-AP9101C
designator U?, comment AP9101C
IC BATT PROT LI-ION 1-CELL SOT26; Manufacturer: Diodes; Manufacturer Part Number: AP9101CK6-AYTRG1; Washability: OK; RoHS: No; Case/Package: SOT-23-6; Packaging: Tape and Reel; ComponentLink1URL: https://www.diodes.com/assets/Datasheets/AP9101C.pdf?src-supplier=Digi-Key; ComponentLink1Description: https://www.diodes.com/assets/Datasheets/AP9101C.pdf?src-supplier=Digi-Key; Supplier 1: Digi-Key; Supplier Part Number 1: AP9101CK6-AYTRG1DICT-ND; Stock: 3270; Pricing: 1=0.44, 10=0.356, 25=0.3256, 100=0.2197, 250=0.1818, 500=0.1667, 1000=0.125 (USD)
footprint SOT23-6
pins: 1 DO, 2 VM, 3 CO, 4 NC, 5 VDD, 6 VSS

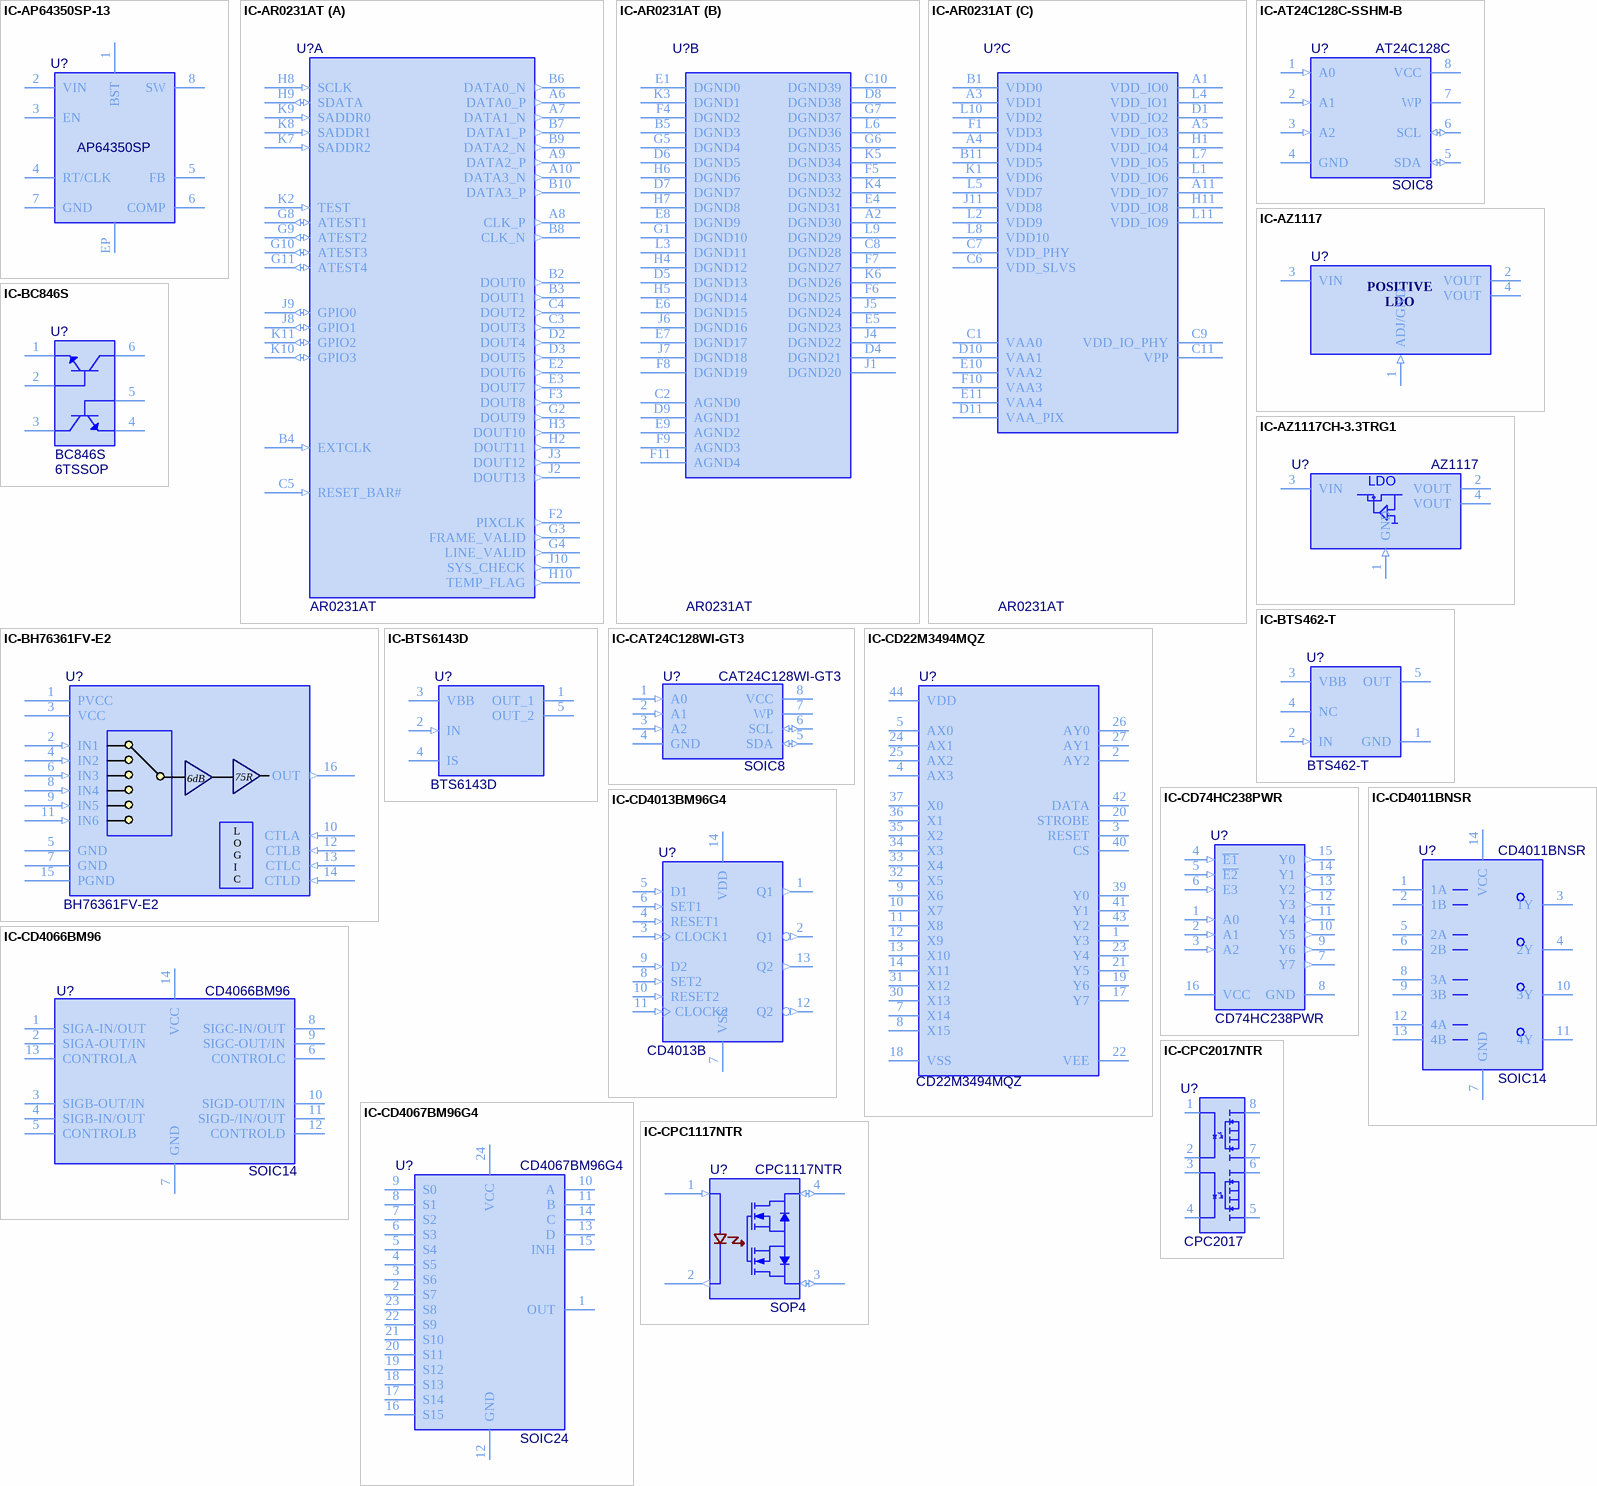
[diagram p17: symbols IC-AP64350SP-13 to IC-CPC2017NTR]

## IC-AP64350SP-13
designator U?, comment AP64350SP
DCDC CONV HV BUCK SO-8EP; Manufacturer 1: Diodes; Manufacturer Part Number: AP64350SP-13; Supplier 1: Digi-Key; RoHS: No; Stock: 3790; Pricing: 1=1,73000, 10=1,55200, 25=1,46440, 100=1,17160, 250=1,02516, 500=0,99586, 1000=0,79083 (USD); Supplier Part Number 1: 31-AP64350SP-13CT-ND
footprint SOIC8-EP (SOIC, 8-Leads, Body 5x4mm, Pitch 1.27mm, IPC Low Density)
pins: 1 BST, 2 VIN, 3 EN, 4 RT/CLK, 5 FB, 6 COMP, 7 GND, 8 SW, EP GND
